# Altium footprint library Inductors SMD.PcbLib: 145 footprints (part 1 of 10)
Each footprint in its own frame and in the unit in brackets; x right, y up, seen from the top. Pads: shape width x height; smd on the part's side, far side on the other; paste and mask are expansions set on the pad; w line width, h text height; cw(c..) or ccw(c..) is an arc to the next point about the centre after c.
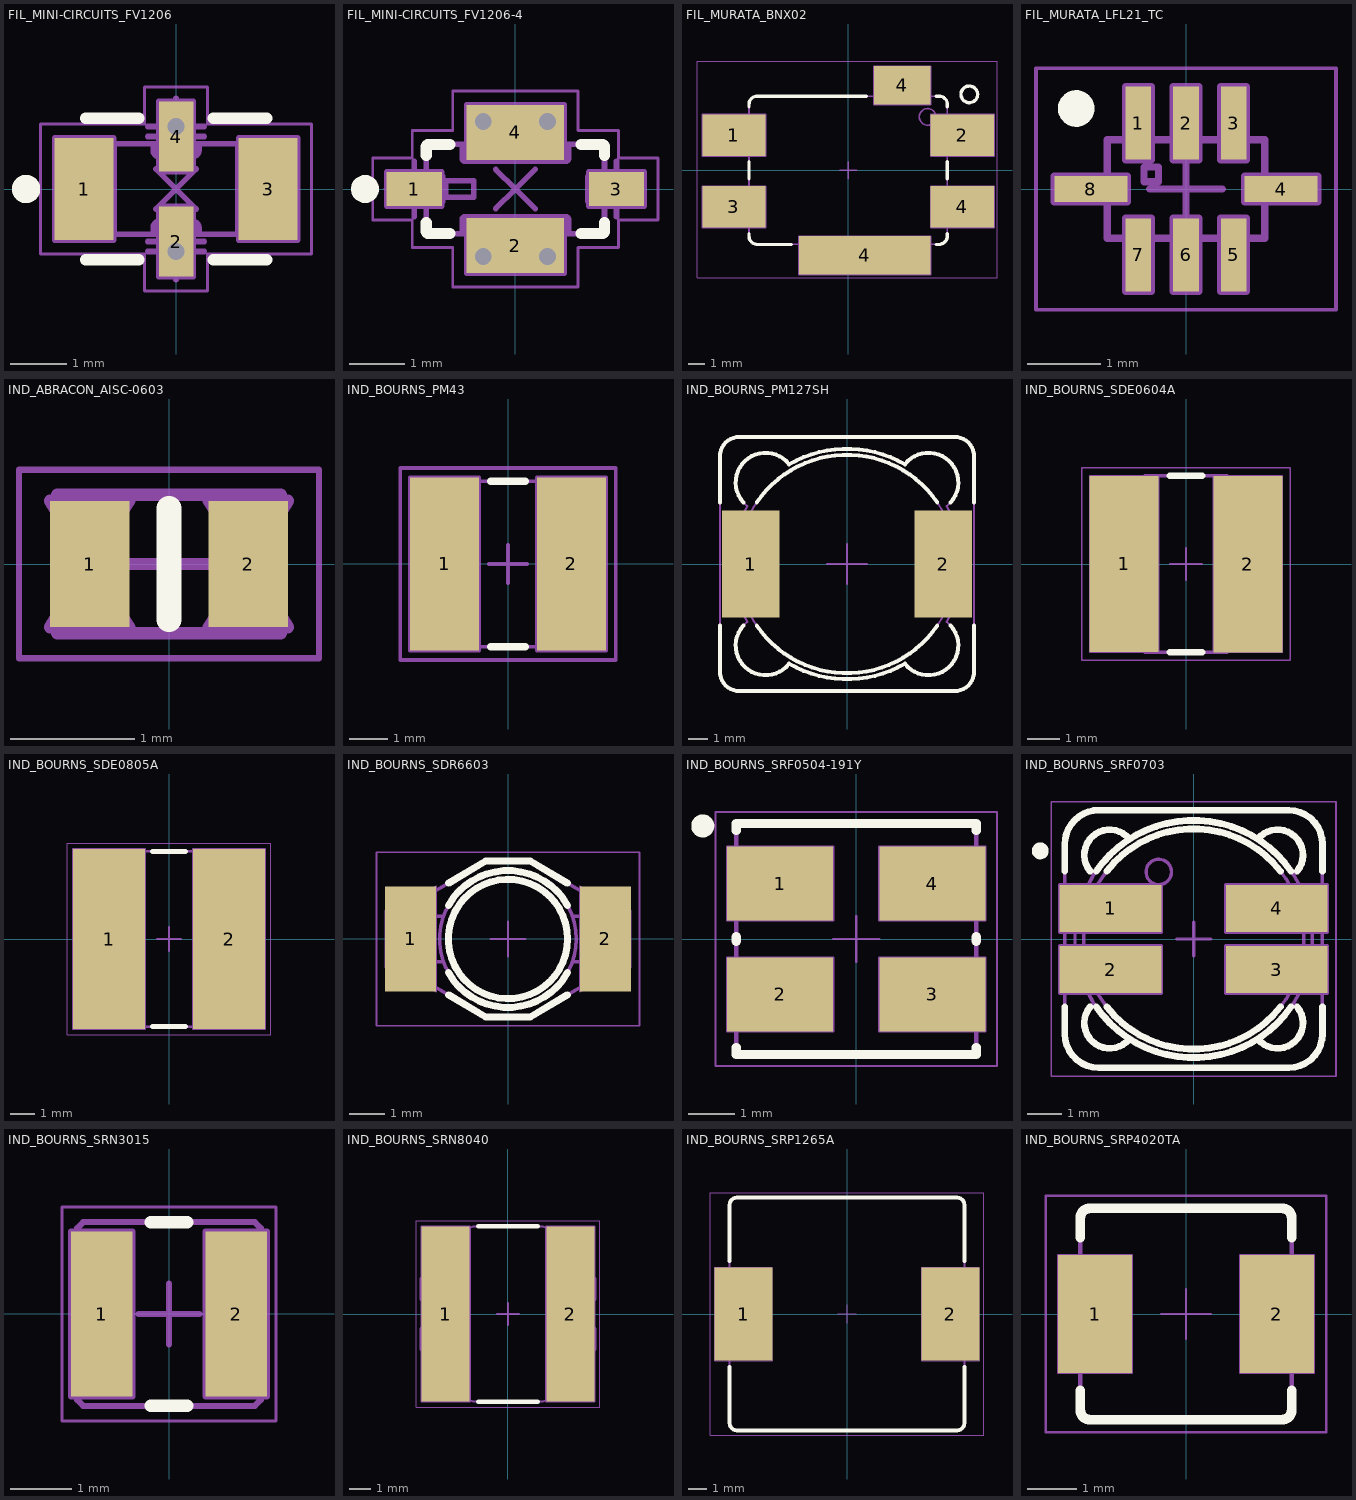
[diagram p0: the footprints below, top view; thin cyan lines are the x and y axes]

## FIL_MINI-CIRCUITS_FV1206 [mm] "MINI-CIRCUITS Case FV1206 - Body 3.2x1.6mm"
height 0.94
pads (4):
  rect 1.04x1.8 smd: 1(-1.625,0) 3(1.625,0)
  rect 0.61x1.245 smd: 2(0,-0.928) 4(0,0.927)
via 0,1.105 diameter 0.6 hole 0.3
via 0,-1.105 diameter 0.6 hole 0.3
Top Overlay:
  circle w0.25: c-2.65,0 r0.125
  lines w0.2: -1.6,-1.25 -0.655,-1.25 ; -1.6,1.25 -0.655,1.25 ; 0.655,-1.25 1.6,-1.25 ; 0.655,1.25 1.6,1.25
Mechanical 8:
  lines w0.1: -2.125,0 -1.625,0 ; -1.625,-0.5 -1.625,0 ; -1.625,0.5 -1.625,0 ; -1.125,0 -1.625,0 ; -0.5,-1.105 0,-1.105 ; -0.5,-0.928 0,-0.928 ; -0.5,0.927 0,0.927 ; -0.5,1.105 0,1.105 ; -0.354,-0.354 0,0 ; -0.354,0.353 0,0 ; 0,-1.605 0,-1.105 ; 0,-0.428 0,-0.928 ; 0,0.427 0,0.927 ; 0,1.605 0,1.105 ; 0.354,-0.354 0,0 ; 0.354,0.353 0,0 ; 0.5,-1.105 0,-1.105 ; 0.5,-0.928 0,-0.928 ; 0.5,0.927 0,0.927 ; 0.5,1.105 0,1.105 ; 1.125,0 1.625,0 ; 1.625,-0.5 1.625,0 ; 1.625,0.5 1.625,0 ; 2.125,0 1.625,0 ; -2.145,-0.9 -2.145,0.9 -1.105,0.9 -1.105,-0.9 -2.145,-0.9 ; -0.305,-1.55 0.305,-1.55 0.305,-0.305 -0.305,-0.305 -0.305,-1.55 ; -0.305,0.305 0.305,0.305 0.305,1.55 -0.305,1.55 -0.305,0.305 ; 1.105,-0.9 1.105,0.9 2.145,0.9 2.145,-0.9 1.105,-0.9
Mechanical 14:
  lines w0.1: -1.5,-0.8 -1.5,0.8 ; -1.4,-0.8 -1.4,0.8 ; -1.3,-0.8 -1.3,0.8 ; -1.2,-0.8 -1.2,0.8 ; -1.1,-0.8 -1.1,0.8 ; -1.09,-0.8 -1.09,0.8 ; -1.09,-0.8 -1.6,-0.8 -1.6,0.8 -1.09,0.8 ; -1.09,-0.8 1.09,-0.8 ; -1.09,-0.8 -1.09,0.8 ; -1.09,0.8 1.09,0.8 ; 1.09,-0.8 1.09,0.8 ; 1.09,-0.8 1.6,-0.8 1.6,0.8 1.09,0.8 ; 1.09,-0.8 1.09,0.8 ; -0.405,-0.8 0.405,-0.8 0.405,-0.685 ccw(c0.29,-0.685) 0.29,-0.57 -0.29,-0.57 ccw(c-0.29,-0.685) -0.405,-0.685 -0.405,-0.8 ; -0.405,0.685 ccw(c-0.29,0.685) -0.29,0.57 0.29,0.57 ccw(c0.29,0.685) 0.405,0.685 0.405,0.8 -0.405,0.8 -0.405,0.685
Mechanical 15:
  lines w0.05: -2.395,-1.15 -2.395,1.15 -0.555,1.15 -0.555,1.8 0.555,1.8 0.555,1.15 2.395,1.15 2.395,-1.15 0.555,-1.15 0.555,-1.8 -0.555,-1.8 -0.555,-1.15 -2.395,-1.15
Drill Drawing:
  lines w0.1: -0.555,-1.05 -0.555,-1.8 0.555,-1.8 0.555,-1.05 ; -0.555,1.05 -0.555,1.8 0.555,1.8 0.555,1.05
  text "capped via" at -2.45,-0.55 h0.5
  text "Filled and" at -2.4,0.2 h0.5
3D body "FIL_MINI-CIRCUITS_FV1206.stp": height 0.94, standoff 0, extent -1.6,-0.8 1.6,0.8

## FIL_MINI-CIRCUITS_FV1206-4 [mm] "MINI-CIRCUITS Case FV1206-4 - Body 3.2x1.6mm"
height 1.04
pads (4):
  rect 0.99x0.61 smd: 1(-1.815,0) 3(1.815,0)
  rect 1.75x0.99 smd: 2(0,-1.015) 4(0,1.015)
via 0.575,-1.21 diameter 0.6 hole 0.3
via -0.575,-1.21 diameter 0.6 hole 0.3
via 0.575,1.21 diameter 0.6 hole 0.3
via -0.575,1.21 diameter 0.6 hole 0.3
Top Overlay:
  circle w0.25: c-2.7,0 r0.125
  lines w0.2: -1.6,-0.605 -1.6,-0.75 ccw(c-1.55,-0.75) -1.55,-0.8 -1.175,-0.8 ; -1.6,0.605 -1.6,0.75 cw(c-1.55,0.75) -1.55,0.8 -1.175,0.8 ; 1.175,-0.8 1.55,-0.8 ccw(c1.55,-0.75) 1.6,-0.75 1.6,-0.605 ; 1.175,0.8 1.55,0.8 cw(c1.55,0.75) 1.6,0.75 1.6,0.605
Mechanical 8:
  circle w0.1: c-0.575,1.21 r0.3
  circle w0.1: c0.575,1.21 r0.3
  circle w0.1: c0.575,-1.21 r0.3
  circle w0.1: c-0.575,-1.21 r0.3
  lines w0.1: -2.315,0 -1.815,0 ; -1.815,-0.5 -1.815,0 ; -1.815,0.5 -1.815,0 ; -1.315,0 -1.815,0 ; -0.875,-1.21 -0.575,-1.21 -0.575,-1.51 ; -0.875,1.21 -0.575,1.21 -0.575,1.51 ; -0.5,-1.015 0,-1.015 ; -0.5,1.015 0,1.015 ; -0.354,-0.354 0,0 ; -0.354,0.354 0,0 ; 0,-1.515 0,-1.015 ; 0,-0.515 0,-1.015 ; 0,0.515 0,1.015 ; 0,1.515 0,1.015 ; 0.354,-0.354 0,0 ; 0.354,0.354 0,0 ; 0.5,-1.015 0,-1.015 ; 0.5,1.015 0,1.015 ; 0.575,-1.51 0.575,-1.21 0.875,-1.21 ; 0.575,1.51 0.575,1.21 0.875,1.21 ; 1.315,0 1.815,0 ; 1.815,-0.5 1.815,0 ; 1.815,0.5 1.815,0 ; 2.315,0 1.815,0 ; -2.31,-0.305 -1.32,-0.305 -1.32,0.305 -2.31,0.305 -2.31,-0.305 ; -0.875,-1.51 0.875,-1.51 0.875,-0.52 -0.875,-0.52 -0.875,-1.51 ; -0.875,0.52 0.875,0.52 0.875,1.51 -0.875,1.51 -0.875,0.52 ; 1.32,-0.305 2.31,-0.305 2.31,0.305 1.32,0.305 1.32,-0.305
Mechanical 14:
  lines w0.1: -1.6,-0.255 -1.35,-0.255 ccw(c-1.35,-0.205) -1.3,-0.205 -1.3,0.205 ccw(c-1.35,0.205) -1.35,0.255 -1.6,0.255 ; -0.955,-0.8 -0.955,-0.55 cw(c-0.905,-0.55) -0.905,-0.5 0.905,-0.5 cw(c0.905,-0.55) 0.955,-0.55 0.955,-0.8 ; -0.955,0.8 -0.955,0.55 ccw(c-0.905,0.55) -0.905,0.5 0.905,0.5 ccw(c0.905,0.55) 0.955,0.55 0.955,0.8 ; 1.6,-0.255 1.35,-0.255 cw(c1.35,-0.205) 1.3,-0.205 1.3,0.205 cw(c1.35,0.205) 1.35,0.255 1.6,0.255 ; -1.6,-0.75 ccw(c-1.55,-0.75) -1.55,-0.8 1.55,-0.8 ccw(c1.55,-0.75) 1.6,-0.75 1.6,0.75 ccw(c1.55,0.75) 1.55,0.8 -1.55,0.8 ccw(c-1.55,0.75) -1.6,0.75 -1.6,-0.75 ; -1.25,-0.15 -1.25,0.15 -0.75,0.15 -0.75,-0.15 -1.25,-0.15
Mechanical 15:
  lines w0.05: -2.56,-0.555 -2.56,0.555 -1.85,0.555 -1.85,1.05 -1.125,1.05 -1.125,1.76 1.125,1.76 1.125,1.05 1.85,1.05 1.85,0.555 2.56,0.555 2.56,-0.555 1.85,-0.555 1.85,-1.05 1.125,-1.05 1.125,-1.76 -1.125,-1.76 -1.125,-1.05 -1.85,-1.05 -1.85,-0.555 -2.56,-0.555
Drill Drawing:
  lines w0.1: -0.875,1.08 -0.875,1.51 0.875,1.51 0.875,1.08 ; -0.875,-1.51 -0.875,-1.08 -0.875,-1.51 ; -0.875,-1.51 0.875,-1.51 ; -0.875,-1.51 0.875,-1.51 ; 0.875,-1.51 0.875,-1.08 0.875,-1.51
  text "capped via" at -2.45,-0.55 h0.5
  text "Filled and" at -2.4,0.2 h0.5
3D body "FIL_MINI-CIRCUITS_FV1206-4.stp": height 1.04, standoff 0, extent -1.6,-0.8 1.6,0.8

## FIL_MURATA_BNX02 [mm] "Block Type EMIFIL LC Combined Type, BNX02* Series"
height 3.3
pads (6):
  rect 3.8x2.5 smd: 1(-6.85,2.1) 2(6.85,2.1) 3(-6.85,-2.2) 4(6.85,-2.2)
  rect 7.9x2.3 smd: 4(1,-5.1)
  rect 3.4x2.3 smd: 4(3.25,5.1)
Top Overlay:
  circle w0.2: c7.268,4.554 r0.5
  lines w0.2: -5.95,-3.8 -5.95,-3.95 ccw(c-5.45,-3.95) -5.45,-4.45 -3.42,-4.45 ; -5.95,-0.5 -5.95,0.5 ; -5.95,3.8 -5.95,3.95 cw(c-5.45,3.95) -5.45,4.45 1.08,4.45 ; 5.28,-4.45 5.45,-4.45 ccw(c5.45,-3.95) 5.95,-3.95 5.95,-3.8 ; 5.28,4.45 5.45,4.45 cw(c5.45,3.95) 5.95,3.95 5.95,3.8 ; 5.95,-0.5 5.95,0.5
Mechanical 8:
  lines w0.1: -7.35,-2.2 -6.85,-2.2 ; -7.35,2.1 -6.85,2.1 ; -6.85,-2.7 -6.85,-2.2 ; -6.85,-1.7 -6.85,-2.2 ; -6.85,1.6 -6.85,2.1 ; -6.85,2.6 -6.85,2.1 ; -6.35,-2.2 -6.85,-2.2 ; -6.35,2.1 -6.85,2.1 ; -0.5,0 0,0 ; 0,-0.5 0,0 ; 0,0.5 0,0 ; 0.5,-5.1 1,-5.1 ; 0.5,0 0,0 ; 1,-5.6 1,-5.1 ; 1,-4.6 1,-5.1 ; 1.5,-5.1 1,-5.1 ; 2.75,5.1 3.25,5.1 ; 3.25,4.6 3.25,5.1 ; 3.25,5.6 3.25,5.1 ; 3.75,5.1 3.25,5.1 ; 6.35,-2.2 6.85,-2.2 ; 6.35,2.1 6.85,2.1 ; 6.85,-2.7 6.85,-2.2 ; 6.85,-1.7 6.85,-2.2 ; 6.85,1.6 6.85,2.1 ; 6.85,2.6 6.85,2.1 ; 7.35,-2.2 6.85,-2.2 ; 7.35,2.1 6.85,2.1 ; -8.75,-3.45 -8.75,-0.95 -4.95,-0.95 -4.95,-3.45 -8.75,-3.45 ; -8.75,0.85 -4.95,0.85 -4.95,3.35 -8.75,3.35 -8.75,0.85 ; -2.95,-6.25 -2.95,-3.95 4.95,-3.95 4.95,-6.25 -2.95,-6.25 ; 1.55,3.95 4.95,3.95 4.95,6.25 1.55,6.25 1.55,3.95 ; 4.95,-3.45 8.75,-3.45 8.75,-0.95 4.95,-0.95 4.95,-3.45 ; 4.95,0.85 4.95,3.35 8.75,3.35 8.75,0.85 4.95,0.85
Mechanical 14:
  circle w0.1: c4.768,3.204 r0.5
  lines w0.1: -5.95,-2.75 -6.05,-2.75 -6.05,-1.45 -5.95,-1.45 ; -5.95,1.45 -6.05,1.45 -6.05,2.75 -5.95,2.75 ; -2.5,-4.45 -2.5,-4.55 4.5,-4.55 4.5,-4.45 ; 2,4.45 2,4.55 4.5,4.55 4.5,4.45 ; 5.95,-2.75 6.05,-2.75 6.05,-1.45 5.95,-1.45 ; 5.95,1.45 6.05,1.45 6.05,2.75 5.95,2.75 ; -5.95,-3.95 ccw(c-5.45,-3.95) -5.45,-4.45 5.45,-4.45 ccw(c5.45,-3.95) 5.95,-3.95 5.95,3.95 ccw(c5.45,3.95) 5.45,4.45 -5.45,4.45 ccw(c-5.45,3.95) -5.95,3.95 -5.95,-3.95
Mechanical 15:
  lines w0.05: -9.07,-6.45 8.93,-6.45 8.93,6.55 -9.07,6.55 -9.07,-6.45
3D body "FIL_MURATA_BNX02.stp": height 3.1, standoff 0, extent -6.05,-4.55 6.05,4.55

## FIL_MURATA_LFL21_TC [mm] "0805 Case, Body 2mm x 1.25mm, Low Pass Filter for Communication Equipment"
height 1.05
pads (8):
  rect 0.35x1 smd: 1(-0.65,0.9) 2(0,0.9) 3(0.65,0.9) 5(0.65,-0.9) 6(0,-0.9) 7(-0.65,-0.9)
  rect 1x0.35 smd: 4(1.3,0) 8(-1.3,0)
Top Overlay:
  circle w0.25: c-1.5,1.1 r0.125
Mechanical 8:
  lines w0.1: -0.5,0 0,0 ; 0,-0.5 0,0 ; 0,0.5 0,0 ; 0.5,0 0,0 ; -1.8,-0.175 -1.3,0 -1.8,0.175 ; -1.8,-0.175 -0.8,-0.175 -0.8,0.175 -1.8,0.175 ; -1.8,-0.175 -1.8,0.175 ; -0.825,-1.4 -0.65,-0.9 -0.475,-1.4 ; -0.825,-1.4 -0.475,-1.4 ; -0.825,-1.4 -0.825,-0.4 -0.475,-0.4 -0.475,-1.4 ; -0.825,1.4 -0.65,0.9 -0.475,1.4 ; -0.825,1.4 -0.825,0.4 -0.475,0.4 -0.475,1.4 ; -0.825,1.4 -0.475,1.4 ; -0.175,-1.4 0,-0.9 0.175,-1.4 ; -0.175,-1.4 0.175,-1.4 ; -0.175,-1.4 -0.175,-0.4 0.175,-0.4 0.175,-1.4 ; -0.175,1.4 0,0.9 0.175,1.4 ; -0.175,1.4 -0.175,0.4 0.175,0.4 0.175,1.4 ; -0.175,1.4 0.175,1.4 ; 0.475,-1.4 0.65,-0.9 0.825,-1.4 ; 0.475,-1.4 0.825,-1.4 ; 0.475,-1.4 0.475,-0.4 0.825,-0.4 0.825,-1.4 ; 0.475,1.4 0.65,0.9 0.825,1.4 ; 0.475,1.4 0.475,0.4 0.825,0.4 0.825,1.4 ; 0.475,1.4 0.825,1.4 ; 1.8,-0.175 1.3,0 1.8,0.175 ; 1.8,-0.175 0.8,-0.175 0.8,0.175 1.8,0.175 ; 1.8,-0.175 1.8,0.175
Mechanical 14:
  lines w0.1: -1.075,-0.144 -0.931,-0.144 ccw(c-0.975,0) -0.975,0.15 -1.075,0.15 ; -0.8,-0.675 -0.8,-0.575 cw(c-0.65,-0.575) -0.5,-0.575 -0.5,-0.675 ; -0.8,0.675 -0.8,0.575 ccw(c-0.65,0.575) -0.5,0.575 -0.5,0.675 ; -0.15,-0.675 -0.15,-0.575 cw(c0,-0.575) 0.15,-0.575 0.15,-0.675 ; -0.15,0.675 -0.15,0.575 ccw(c0,0.575) 0.15,0.575 0.15,0.675 ; 0.5,-0.675 0.5,-0.575 cw(c0.65,-0.575) 0.8,-0.575 0.8,-0.675 ; 0.5,0.675 0.5,0.575 ccw(c0.65,0.575) 0.8,0.575 0.8,0.675 ; 1.075,-0.15 0.975,-0.15 cw(c0.975,0) 0.975,0.15 1.075,0.15 ; -1.075,-0.675 -1.075,0.675 1.075,0.675 1.075,-0.675 -1.075,-0.675 ; -0.575,0.1 -0.575,0.3 -0.375,0.3 -0.375,0.1 -0.575,0.1
Mechanical 15:
  lines w0.05: -2.05,-1.65 -2.05,1.65 2.05,1.65 2.05,-1.65 -2.05,-1.65
3D body "FIL_MURATA_LFL21_TC.stp": height 1.05, standoff 0, extent -1.075,-0.675 1.075,0.675

## IND_ABRACON_AISC-0603 [mm] "Inductor, Molded Body; 1.8mm L X 1.12mm W, AISC-0603 Series"
height 1.02
pads (2):
  rect 0.64x1.02 smd: 1(-0.64,0) 2(0.64,0)
Top Overlay:
  lines w0.2: 0,-0.45 0,0.45
Mechanical 8:
  lines w0.1: -0.96,-0.51 -0.64,0 ; -0.96,0.51 -0.64,0 ; -0.5,0 0,0 ; -0.32,-0.51 -0.64,0 ; -0.32,0.51 -0.64,0 ; 0,-0.5 0,0 ; 0,0.5 0,0 ; 0.32,-0.51 0.64,0 ; 0.32,0.51 0.64,0 ; 0.5,0 0,0 ; 0.96,-0.51 0.64,0 ; 0.96,0.51 0.64,0
Mechanical 14:
  lines w0.1: -0.9,-0.56 0.9,-0.56 0.9,0.56 -0.9,0.56 -0.9,-0.56
Mechanical 15:
  lines w0.05: -1.21,-0.76 -1.21,0.76 1.21,0.76 1.21,-0.76 -1.21,-0.76
3D body "IND_ABRACON_AISC-0603.stp": height 1, standoff 0, extent -0.9,-0.56 0.9,0.56

## IND_BOURNS_PM43 [mm] "SMD Inductor  Body Width 4.5mm Body Lenght 4mm Height 3.5mm"
height 3.5
pads (2):
  rect 1.8x4.5 smd: 1(-1.65,0) 2(1.65,0)
Top Overlay:
  lines w0.2: -0.45,-2.15 0.45,-2.15 ; -0.45,2.15 0.45,2.15
Mechanical 8:
  lines w0.1: -2.15,0 -1.65,0 ; -1.65,-0.5 -1.65,0 ; -1.65,0.5 -1.65,0 ; -1.15,0 -1.65,0 ; -0.5,0 0,0 ; 0,-0.5 0,0 ; 0,0.5 0,0 ; 0.5,0 0,0 ; 1.15,0 1.65,0 ; 1.65,-0.5 1.65,0 ; 1.65,0.5 1.65,0 ; 2.15,0 1.65,0 ; -2.55,-2.25 -2.55,2.25 -0.75,2.25 -0.75,-2.25 -2.55,-2.25 ; 0.75,-2.25 0.75,2.25 2.55,2.25 2.55,-2.25 0.75,-2.25
Mechanical 14:
  lines w0.1: -0.75,-2.15 -0.75,2.15 ; 0.75,-2.15 0.75,2.15 ; -2.381,-0.3 ccw(c0,0) -1.067,-2.15 1.067,-2.15 ccw(c0,0) 2.381,-0.3 2.1,-0.3 cw(c2.1,0) 2.1,0.3 2.381,0.3 ccw(c0,0) 1.067,2.15 -1.067,2.15 ccw(c0,0) -2.381,0.3 -2.1,0.3 cw(c-2.1,0) -2.1,-0.3 -2.381,-0.3
Mechanical 15:
  lines w0.1: -2.8,-2.5 2.8,-2.5 2.8,2.5 -2.8,2.5 -2.8,-2.5
3D body "IND_BOURNS_PM43.stp": height 3.5, standoff 0, extent -2.381,-2.15 2.381,2.15

## IND_BOURNS_PM127SH [mm] "SMD Inductor Body Width 12.5mm Body Lenght 12.5mm Height 8mm"
height 8
pads (2):
  rect 2.9x5.4 smd: 1(-4.85,0) 2(4.85,0)
Top Overlay:
  lines w0.2: -6.4,-3.1 -6.4,-5.4 ccw(c-5.4,-5.4) -5.4,-6.4 5.4,-6.4 ccw(c5.4,-5.4) 6.4,-5.4 6.4,-3.1 ; -6.4,3.1 -6.4,5.4 cw(c-5.4,5.4) -5.4,6.4 5.4,6.4 cw(c5.4,5.4) 6.4,5.4 6.4,3.1 ; -5.218,-3.1 ccw(c-4.101,-4.101) -2.912,-5.016 ccw(c0,0) 2.912,-5.016 ccw(c4.101,-4.101) 5.218,-3.1 ; -5.218,3.1 cw(c-4.101,4.101) -2.912,5.016 cw(c0,0) 2.912,5.016 cw(c4.101,4.101) 5.218,3.1 ; -4.543,-3.1 ccw(c0,0) 4.543,-3.1 ; -4.543,3.1 cw(c0,0) 4.543,3.1
Mechanical 8:
  lines w0.1: -5.85,0 -4.85,0 ; -4.85,-1 -4.85,0 ; -4.85,1 -4.85,0 ; -3.85,0 -4.85,0 ; -1,0 0,0 ; 0,-1 0,0 ; 0,1 0,0 ; 1,0 0,0 ; 3.85,0 4.85,0 ; 4.85,-1 4.85,0 ; 4.85,1 4.85,0 ; 5.85,0 4.85,0
Mechanical 14:
  circle w0.1: c0,0 r5.5
  lines w0.1: -6.4,-5.4 ccw(c-5.4,-5.4) -5.4,-6.4 5.4,-6.4 ccw(c5.4,-5.4) 6.4,-5.4 6.4,5.4 ccw(c5.4,5.4) 5.4,6.4 -5.4,6.4 ccw(c-5.4,5.4) -6.4,5.4 -6.4,-5.4 ; -5.016,-2.912 ccw(c-4.101,-4.101) -2.912,-5.016 ccw(c0,0) 2.912,-5.016 ccw(c4.101,-4.101) 5.016,-2.912 ccw(c0,0) 5.016,2.912 ccw(c4.101,4.101) 2.912,5.016 ccw(c0,0) -2.912,5.016 ccw(c-4.101,4.101) -5.016,2.912 ccw(c0,0) -5.016,-2.912
3D body "IND_BOURNS_PM127SH.stp": height 8, standoff 0, extent -6.4,-6.4 6.4,6.4

## IND_BOURNS_SDE0604A [mm] "SMD Inductor Body Width 5.5mm Body Lenght 6.1mm Height 4.8mm"
height 4.8
pads (2):
  rect 2.15x5.5 smd: 1(-1.925,0.002) 2(1.925,0)
Top Overlay:
  lines w0.2: -0.5,-2.748 0.5,-2.748 ; -0.5,2.752 0.5,2.752
Mechanical 8:
  lines w0.05: -2.425,0.002 -1.925,0.002 ; -1.925,-0.498 -1.925,0.002 ; -1.925,0.502 -1.925,0.002 ; -1.425,0.002 -1.925,0.002 ; -0.5,0.002 0.5,0.002 ; 0,-0.498 0,0.502 ; 1.425,0.002 2.425,0.002 ; 1.925,-0.498 1.925,0.502 ; -3,-2.748 -3,2.752 -0.85,2.752 -0.85,-2.748 -3,-2.748 ; 0.85,-2.748 0.85,2.752 3,2.752 3,-2.748 0.85,-2.748
Mechanical 14:
  lines w0.1: -2.892,-0.564 cw(c-2.59,-0.74) -2.641,-0.394 ; -2.603,1.281 -2.603,1.281 ; -2.329,-0.148 -2.44,-0.148 cw(c-2.44,-0.008) -2.44,0.132 -2.322,0.132 ; 2.322,0.132 2.44,0.132 cw(c2.44,-0.008) 2.44,-0.148 2.329,-0.148 ; 2.892,-0.564 ccw(c2.59,-0.74) 2.641,-0.394 ; -2.641,-0.394 ccw(c-2.59,-0.74) -2.925,-0.842 ccw(c0.368,0.332) -1.284,-2.748 1.284,-2.748 ccw(c-0.368,0.332) 2.925,-0.842 ccw(c2.59,-0.74) 2.641,-0.394 ; -2.641,-0.394 ccw(c-2.7,0.002) -2.641,0.398 ; -2.641,0.398 cw(c-2.59,0.744) -2.925,0.846 cw(c0.368,-0.328) -1.284,2.752 1.285,2.752 cw(c-0.368,-0.329) 2.925,0.846 cw(c2.59,0.744) 2.641,0.398 ; -2.641,0.398 -2.641,0.398 ; 2.641,-0.394 cw(c2.7,0.002) 2.641,0.398 ; 2.641,0.398 2.641,0.398
Mechanical 15:
  lines w0.05: -3.25,-2.998 3.25,-2.998 3.25,3.002 -3.25,3.002 -3.25,-2.998
3D body "IND_BOURNS_SDE0604A.stp": height 4.8, standoff 0, extent -2.775,-2.588 2.804,2.612

## IND_BOURNS_SDE0805A [mm] "SMD Inductor Body Width 7.3mm Body Lenght 9.1mm Height 5.5mm"
height 5.5
pads (2):
  rect 3x7.5 smd: 1(-2.5,0) 2(2.5,0)
Top Overlay:
  lines w0.2: -0.7,-3.65 0.7,-3.65 ; -0.7,3.65 0.7,3.65
Mechanical 8:
  lines w0.1: -3,0 -2.5,0 ; -2.5,-0.5 -2.5,0 ; -2.5,0.5 -2.5,0 ; -2,0 -2.5,0 ; -0.5,0 0,0 ; 0,-0.5 0,0 ; 0,0.5 0,0 ; 0.5,0 0,0 ; 2,0 2.5,0 ; 2.5,-0.5 2.5,0 ; 2.5,0.5 2.5,0 ; 3,0 2.5,0 ; -4,-3.75 -4,3.75 -1,3.75 -1,-3.75 -4,-3.75 ; 1,-3.75 1,3.75 4,3.75 4,-3.75 1,-3.75
Mechanical 14:
  lines w0.1: -3.927,-0.992 ccw(c0,0) -1.755,-3.65 1.755,-3.65 ccw(c0,0) 3.927,-0.992 cw(c4.05,0) 3.927,0.992 ccw(c0,0) 1.755,3.65 -1.755,3.65 ccw(c0,0) -3.927,0.992 cw(c-4.05,0) -3.927,-0.992
Mechanical 15:
  lines w0.05: -4.25,-4 4.25,-4 4.25,4 -4.25,4 -4.25,-4
3D body "IND_BOURNS_SDE0805A.stp": height 5.5, standoff 0, extent -3.926,-3.65 3.927,3.65

## IND_BOURNS_SDR6603 [mm] "SMD Inductor  Body Width 4.45mm Body Lenght 6.6mm Height 2.92mm"
height 2.92
pads (2):
  rect 1.45x3 smd: 1(-2.775,0) 2(2.775,0)
Top Overlay:
  circle w0.2: c0,0 r1.7
  lines w0.2: -1.7,-1.59 -0.635,-2.225 0.635,-2.225 1.7,-1.59 ; -1.7,-0.955 ccw(c0,0) 1.7,-0.955 ; -1.7,0.955 cw(c0,0) 1.7,0.955 ; -1.7,1.59 -0.635,2.225 0.635,2.225 1.7,1.59
Mechanical 8:
  lines w0.05: -0.5,0 0,0 ; 0,-0.5 0,0 ; 0,0.5 0,0 ; 0.5,0 0,0 ; -3.5,-0.8 -3.5,0.8 -2.05,1.5 -2.05,-1.5 -3.5,-0.8 ; 2.05,-1.5 2.05,1.5 3.5,0.8 3.5,-0.8 2.05,-1.5
Mechanical 14:
  circle w0.1: c0,0 r1.95
  circle w0.1: c0,0 r1.7
  lines w0.1: -1.838,-0.65 -2.55,-0.65 cw(c-2.55,0) -2.55,0.65 -1.838,0.65 ; 1.838,-0.65 2.55,-0.65 ccw(c2.55,0) 2.55,0.65 1.838,0.65 ; -3.3,-0.635 -0.635,-2.225 0.635,-2.225 3.3,-0.635 3.3,0.635 0.635,2.225 -0.635,2.225 -3.3,0.635 -3.3,-0.635
Mechanical 15:
  lines w0.05: -3.75,-2.475 3.75,-2.475 3.75,2.475 -3.75,2.475 -3.75,-2.475
3D body "IND_BOURNS_SDR6603.stp": height 2.92, standoff 0, extent -3.3,-2.225 3.3,2.225

## IND_BOURNS_SRF0504-191Y [mm] "SMD Inductor Body Width 5mm Body Lenght 4.8mm Height 4.8mm"
height 4.8
pads (4):
  rect 2.3x1.6 smd: 1(-1.65,1.2) 2(-1.65,-1.2) 3(1.65,-1.2) 4(1.65,1.2)
Top Overlay:
  circle w0.25: c-3.325,2.45 r0.125
  lines w0.2: -2.6,-2.35 -2.6,-2.5 ; -2.6,-0.05 -2.6,0.05 ; -2.6,2.35 -2.6,2.5 2.6,2.5 2.6,2.35 ; 2.6,-2.35 2.6,-2.5 ; 2.6,-0.05 2.6,0.05 ; -2.6,-2.5 2.6,-2.5 ; -2.6,-2.5 2.6,-2.5
Mechanical 8:
  lines w0.05: -2.15,-1.2 -1.65,-1.2 ; -2.15,1.2 -1.65,1.2 ; -1.65,-1.7 -1.65,-1.2 ; -1.65,-0.7 -1.65,-1.2 ; -1.65,0.7 -1.65,1.2 ; -1.65,1.7 -1.65,1.2 ; -1.15,-1.2 -1.65,-1.2 ; -1.15,1.2 -1.65,1.2 ; -0.5,0 0,0 ; 0,-0.5 0,0 ; 0,0.5 0,0 ; 0.5,0 0,0 ; 1.15,-1.2 1.65,-1.2 ; 1.15,1.2 1.65,1.2 ; 1.65,-1.7 1.65,-1.2 ; 1.65,-0.7 1.65,-1.2 ; 1.65,0.7 1.65,1.2 ; 1.65,1.7 1.65,1.2 ; 2.15,-1.2 1.65,-1.2 ; 2.15,1.2 1.65,1.2 ; -2.8,-2 -2.8,-0.4 -0.5,-0.4 -0.5,-2 -2.8,-2 ; -2.8,0.4 -0.5,0.4 -0.5,2 -2.8,2 -2.8,0.4 ; 0.5,-2 2.8,-2 2.8,-0.4 0.5,-0.4 0.5,-2 ; 0.5,0.4 2.8,0.4 2.8,2 0.5,2 0.5,0.4
Mechanical 14:
  lines w0.1: -2.6,-2.5 2.6,-2.5 2.6,2.5 -2.6,2.5 -2.6,-2.5
Mechanical 15:
  lines w0.05: -3.05,-2.75 3.05,-2.75 3.05,2.75 -3.05,2.75 -3.05,-2.75
3D body "IND_BOURNS_SRF0504-191Y.stp": height 4.8, standoff 0, extent -2.6,-2.5 2.6,2.5

## IND_BOURNS_SRF0703 [mm] "SMD Inductor Body Width 7.6mm Body Lenght 7.6mm Height 3.6mm"
height 3.6
pads (4):
  rect 3x1.4 smd: 1(-2.45,0.9) 2(-2.45,-0.9) 3(2.45,-0.9) 4(2.45,0.9)
Top Overlay:
  circle w0.25: c-4.525,2.6 r0.125
  lines w0.2: -3.8,-2 -3.8,-2.8 ccw(c-2.8,-2.8) -2.8,-3.8 2.8,-3.8 ccw(c2.8,-2.8) 3.8,-2.8 3.8,-2 ; -3.8,2 -3.8,2.8 cw(c-2.8,2.8) -2.8,3.8 2.8,3.8 cw(c2.8,2.8) 3.8,2.8 3.8,2 ; -3.055,-2 ccw(c-2.475,-2.475) -1.891,-2.945 ; -3.055,2 cw(c-2.475,2.475) -1.891,2.945 ; -2.872,-2 ccw(c0,0) 2.872,-2 ; -2.872,2 cw(c0,0) 2.872,2 ; -2.562,-2 ccw(c0,0) 2.562,-2 ; -2.562,2 cw(c0,0) 2.562,2 ; 1.891,-2.945 ccw(c2.475,-2.475) 3.055,-2 ; 1.891,2.945 cw(c2.475,2.475) 3.055,2
Mechanical 8:
  lines w0.1: -2.95,-0.9 -2.45,-0.9 ; -2.95,0.9 -2.45,0.9 ; -2.45,-1.4 -2.45,-0.9 ; -2.45,-0.4 -2.45,-0.9 ; -2.45,0.4 -2.45,0.9 ; -2.45,1.4 -2.45,0.9 ; -1.95,-0.9 -2.45,-0.9 ; -1.95,0.9 -2.45,0.9 ; -0.5,0 0,0 ; 0,-0.5 0,0 ; 0,0.5 0,0 ; 0.5,0 0,0 ; 1.95,-0.9 2.45,-0.9 ; 1.95,0.9 2.45,0.9 ; 2.45,-1.4 2.45,-0.9 ; 2.45,-0.4 2.45,-0.9 ; 2.45,0.4 2.45,0.9 ; 2.45,1.4 2.45,0.9 ; 2.95,-0.9 2.45,-0.9 ; 2.95,0.9 2.45,0.9 ; -3.95,-1.6 -3.95,-0.2 -0.95,-0.2 -0.95,-1.6 -3.95,-1.6 ; -3.95,0.2 -3.95,1.6 -0.95,1.6 -0.95,0.2 -3.95,0.2 ; 0.95,-1.6 3.95,-1.6 3.95,-0.2 0.95,-0.2 0.95,-1.6 ; 0.95,0.2 3.95,0.2 3.95,1.6 0.95,1.6 0.95,0.2
Mechanical 14:
  circle w0.1: c-1.028,1.978 r0.375
  circle w0.1: c0,0 r3.25
  circle w0.1: c0,0 r3.5
  lines w0.1: -2.945,-1.891 ccw(c-2.475,-2.475) -1.891,-2.945 ; -2.945,1.891 cw(c-2.475,2.475) -1.891,2.945 ; 1.891,-2.945 ccw(c2.475,-2.475) 2.945,-1.891 ; 1.891,2.945 cw(c2.475,2.475) 2.945,1.891 ; -3.8,-2.8 ccw(c-2.8,-2.8) -2.8,-3.8 2.8,-3.8 ccw(c2.8,-2.8) 3.8,-2.8 3.8,2.8 ccw(c2.8,2.8) 2.8,3.8 -2.8,3.8 ccw(c-2.8,2.8) -3.8,2.8 -3.8,-2.8
Mechanical 15:
  lines w0.05: -4.2,-4.05 4.2,-4.05 4.2,4.05 -4.2,4.05 -4.2,-4.05
3D body "IND_BOURNS_SRF0703.stp": height 3.6, standoff 0, extent -3.8,-3.8 3.8,3.8

## IND_BOURNS_SRN3015 [mm] "SMD Inductor  Body Width 3.0mm Body Lenght 3.0mm Height 1.5mm, SRN3015 Series"
height 1.5
pads (2):
  rect 1x2.7 smd: 1(-1.1,0) 2(1.1,0)
Top Overlay:
  lines w0.2: -0.3,-1.5 0.3,-1.5 ; -0.3,1.5 0.3,1.5
Mechanical 8:
  lines w0.1: -1.6,0 -1.1,0 ; -1.1,-0.5 -1.1,0 ; -1.1,0.5 -1.1,0 ; -0.6,0 -1.1,0 ; -0.5,0 0,0 ; 0,-0.5 0,0 ; 0,0.5 0,0 ; 0.5,0 0,0 ; 0.6,0 1.1,0 ; 1.1,-0.5 1.1,0 ; 1.1,0.5 1.1,0 ; 1.6,0 1.1,0 ; -1.6,-1.35 -1.6,1.35 -0.6,1.35 -0.6,-1.35 -1.6,-1.35 ; 0.6,-1.35 0.6,1.35 1.6,1.35 1.6,-1.35 0.6,-1.35
Mechanical 14:
  lines w0.1: -1.5,-1.4 -1.5,1.4 -1.4,1.5 1.4,1.5 1.5,1.4 1.5,-1.4 1.4,-1.5 -1.4,-1.5 -1.5,-1.4
Mechanical 15:
  lines w0.05: -1.75,-1.75 -1.75,1.75 1.75,1.75 1.75,-1.75 -1.75,-1.75
3D body "IND_BOURNS_SRN3015.stp": height 1.5, standoff 0, extent -1.51,-1.5 1.51,1.5

## IND_BOURNS_SRN8040 [mm] "SMD Inductor  Body Width 8.0mm Body Lenght 8.0mm Height 4mm, SRN8040 Series"
height 4
pads (2):
  rect 2.2x8 smd: 1(-2.85,0) 2(2.85,0)
Top Overlay:
  lines w0.2: -1.35,-4 1.35,-4 ; -1.35,4 1.35,4
Mechanical 8:
  lines w0.1: -3.35,0 -2.85,0 ; -2.85,-0.5 -2.85,0 ; -2.85,0.5 -2.85,0 ; -2.35,0 -2.85,0 ; -0.5,0 0,0 ; 0,-0.5 0,0 ; 0,0.5 0,0 ; 0.5,0 0,0 ; 2.35,0 2.85,0 ; 2.85,-0.5 2.85,0 ; 2.85,0.5 2.85,0 ; 3.35,0 2.85,0 ; -3.95,-4 -1.75,-4 -1.75,4 -3.95,4 -3.95,-4 ; 1.75,-4 3.95,-4 3.95,4 1.75,4 1.75,-4
Mechanical 14:
  lines w0.1: -4,-1.6 ccw(c0,0) -1.6,-4 1.6,-4 ccw(c0,0) 4,-1.6 4,-0.731 ccw(c3.8,-0.731) 3.883,-0.549 3.693,-0.463 cw(c3.776,-0.281) 3.576,-0.281 3.576,0.281 cw(c3.776,0.281) 3.693,0.463 3.883,0.549 ccw(c3.8,0.731) 4,0.731 4,1.6 ccw(c0,0) 1.6,4 -1.6,4 ccw(c0,0) -4,1.6 -4,0.731 ccw(c-3.8,0.731) -3.883,0.549 -3.693,0.463 cw(c-3.776,0.281) -3.576,0.281 -3.576,-0.281 cw(c-3.776,-0.281) -3.693,-0.463 -3.883,-0.549 ccw(c-3.8,-0.731) -4,-0.731 -4,-1.6
Mechanical 15:
  lines w0.05: -4.2,-4.25 4.2,-4.25 4.2,4.25 -4.2,4.25 -4.2,-4.25
3D body "IND_BOURNS_SRN8040.stp": height 4, standoff 0, extent -4,-4 4,4

## IND_BOURNS_SRP1265A [mm] "Shielded SMD Power Inductor"
height 6.2
pads (2):
  rect 3.1x5 smd: 1(-5.55,0) 2(5.55,0)
Top Overlay:
  lines w0.2: -6.3,-2.85 -6.3,-5.85 ccw(c-5.9,-5.85) -5.9,-6.25 5.9,-6.25 ccw(c5.9,-5.85) 6.3,-5.85 6.3,-2.85 ; -6.3,2.85 -6.3,5.85 cw(c-5.9,5.85) -5.9,6.25 5.9,6.25 cw(c5.9,5.85) 6.3,5.85 6.3,2.85
Mechanical 8:
  lines w0.05: -0.5,0 0,0 ; 0,-0.5 0,0 ; 0,0.5 0,0 ; 0.5,0 0,0 ; -7.1,-2.5 -7.1,2.5 -4,2.5 -4,-2.5 ; -7.1,-2.5 -4,-2.5 ; -7.1,-2.5 -5.55,0 -4,-2.5 ; 4,-2.5 5.55,0 7.1,-2.5 ; 4,-2.5 4,2.5 7.1,2.5 7.1,-2.5 ; 4,-2.5 7.1,-2.5
Mechanical 14:
  lines w0.1: -6.3,-2.35 -6.75,-2.35 -6.75,2.35 -6.3,2.35 ; 6.3,-2.35 6.75,-2.35 6.75,2.35 6.3,2.35 6.3,0 ; -6.3,-5.85 ccw(c-5.9,-5.85) -5.9,-6.25 5.9,-6.25 ccw(c5.9,-5.85) 6.3,-5.85 6.3,5.85 ccw(c5.9,5.85) 5.9,6.25 -5.9,6.25 ccw(c-5.9,5.85) -6.3,5.85 -6.3,-5.85
Mechanical 15:
  lines w0.05: -0.5,0 0,0 ; 0,-0.5 0,0 ; 0,0.5 0,0 ; 0.5,0 0,0 ; -7.35,-6.5 7.35,-6.5 ; -7.35,-6.5 -7.35,6.5 ; -7.35,-6.5 -7.35,6.5 ; -7.35,-6.5 7.35,-6.5 ; -7.35,6.5 7.35,6.5 ; -7.35,6.5 7.35,6.5 ; 7.35,-6.5 7.35,6.5 ; 7.35,-6.5 7.35,6.5
3D body "IND_BOURNS_SRP1265A.stp": height 6.3, standoff 0, extent -6.45,-6.25 6.45,6.25

## IND_BOURNS_SRP4020TA [mm] "SMD Inductor Body Width 4.7mm Body Lenght 4.3mm Height 2mm"
height 2
pads (2):
  rect 1.5x2.4 smd: 1(-1.85,0) 2(1.85,0)
Top Overlay:
  lines w0.2: -2.15,-1.55 -2.15,-1.95 ccw(c-1.95,-1.95) -1.95,-2.15 1.95,-2.15 ccw(c1.95,-1.95) 2.15,-1.95 2.15,-1.55 ; -2.15,1.55 -2.15,1.95 cw(c-1.95,1.95) -1.95,2.15 1.95,2.15 cw(c1.95,1.95) 2.15,1.95 2.15,1.55
Mechanical 8:
  lines w0.05: -2.35,0 -1.85,0 ; -1.85,-0.5 -1.85,0 ; -1.85,0.5 -1.85,0 ; -1.35,0 -1.85,0 ; -0.5,0 0,0 ; 0,-0.5 0,0 ; 0,0.5 0,0 ; 0.5,0 0,0 ; 1.35,0 1.85,0 ; 1.85,-0.5 1.85,0 ; 1.85,0.5 1.85,0 ; 2.35,0 1.85,0 ; -2.6,-1.2 -2.6,1.2 -1.1,1.2 -1.1,-1.2 -2.6,-1.2 ; 1.1,-1.2 1.1,1.2 2.6,1.2 2.6,-1.2 1.1,-1.2
Mechanical 14:
  lines w0.1: -2.15,-1.1 -2.35,-1.1 -2.35,1.1 -2.15,1.1 ; 2.15,-1.1 2.35,-1.1 2.35,1.1 2.15,1.1 ; -2.15,-1.95 ccw(c-1.95,-1.95) -1.95,-2.15 1.95,-2.15 ccw(c1.95,-1.95) 2.15,-1.95 2.15,1.95 ccw(c1.95,1.95) 1.95,2.15 -1.95,2.15 ccw(c-1.95,1.95) -2.15,1.95 -2.15,-1.95
Mechanical 15:
  lines w0.05: -2.85,-2.4 -2.85,2.4 2.85,2.4 2.85,-2.4 -2.85,-2.4
3D body "IND_BOURNS_SRP4020TA.stp": height 2, standoff 0, extent -2.35,-2.15 2.35,2.15